# Altium schematic symbol library AliPadash.SchLib: 1186 symbols (part 4 of 6) (continued)
## MYC2_CON80 (continued)
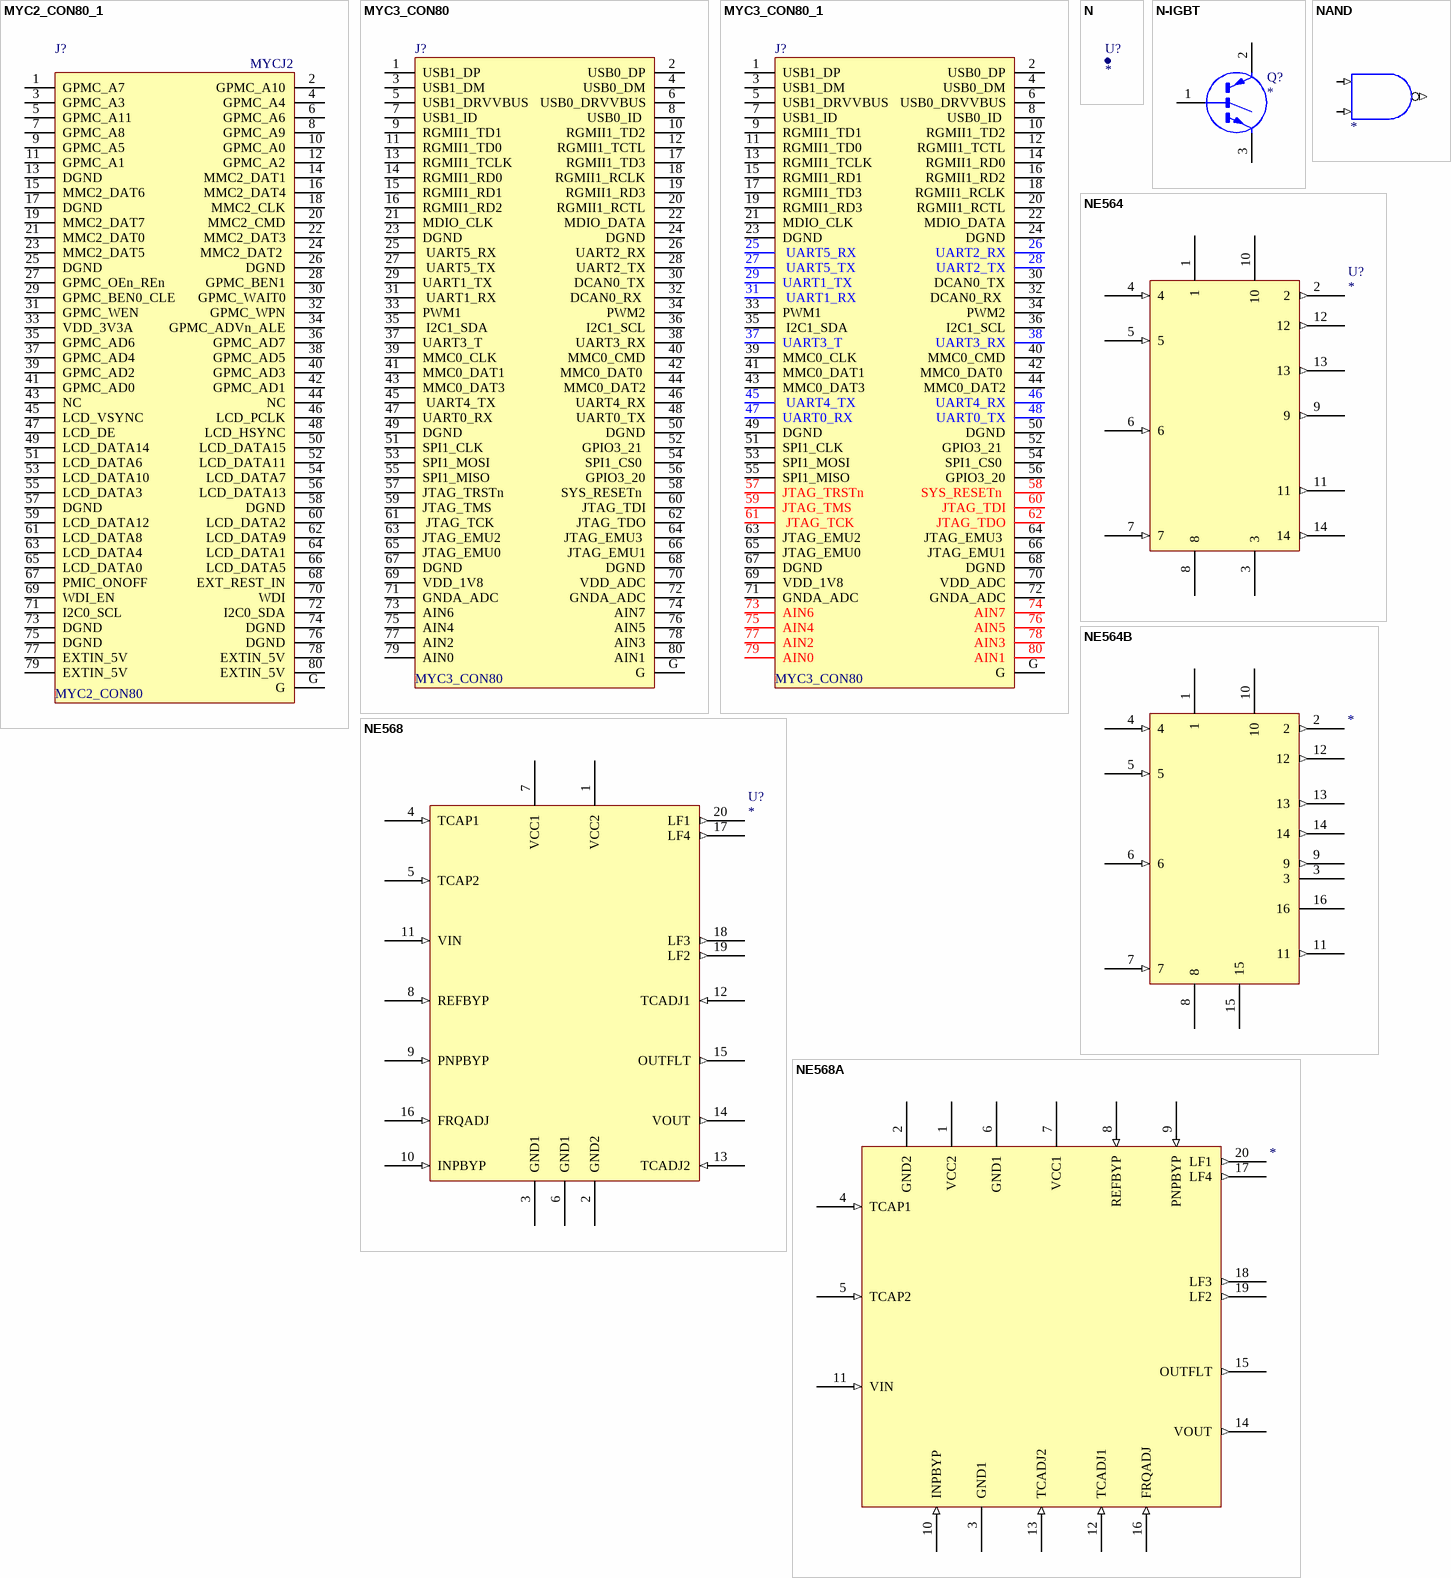
[diagram p45: symbols MYC2_CON80_1 to NE568A]
text: MYCJ2

## MYC2_CON80_1
designator J?, comment MYC2_CON80
footprint BTB2X40F (SON, 80-Leads, Body 36/20x6/00mm, Pitch 0/80mm, IPC Medium Density)
pins: 1 GPMC_A7, 2 GPMC_A10, 3 GPMC_A3, 4 GPMC_A4, 5 GPMC_A11, 6 GPMC_A6, 7 GPMC_A8, 8 GPMC_A9, 9 GPMC_A5, 10 GPMC_A0, 11 GPMC_A1, 12 GPMC_A2, 13 DGND, 14 MMC2_DAT1, 15 MMC2_DAT6, 16 MMC2_DAT4, 17 DGND, 18 MMC2_CLK, 19 MMC2_DAT7, 20 MMC2_CMD, 21 MMC2_DAT0, 22 MMC2_DAT3, 23 MMC2_DAT5 , 24 MMC2_DAT2 , 25 DGND, 26 DGND, 27 GPMC_OEn_REn, 28 GPMC_BEN1, 29 GPMC_BEN0_CLE, 30 GPMC_WAIT0, 31 GPMC_WEN, 32 GPMC_WPN, 33 VDD_3V3A, 34 GPMC_ADVn_ALE, 35 GPMC_AD6, 36 GPMC_AD7, 37 GPMC_AD4, 38 GPMC_AD5, 39 GPMC_AD2, 40 GPMC_AD3, 41 GPMC_AD0, 42 GPMC_AD1, 43 NC, 44 NC, 45 LCD_VSYNC, 46 LCD_PCLK, 47 LCD_DE, 48 LCD_HSYNC, 49 LCD_DATA14, 50 LCD_DATA15, 51 LCD_DATA6, 52 LCD_DATA11, 53 LCD_DATA10, 54 LCD_DATA7, 55 LCD_DATA3, 56 LCD_DATA13, 57 DGND, 58 DGND, 59 LCD_DATA12, 60 LCD_DATA2, 61 LCD_DATA8, 62 LCD_DATA9, 63 LCD_DATA4, 64 LCD_DATA1, 65 LCD_DATA0, 66 LCD_DATA5, 67 PMIC_ONOFF, 68 EXT_REST_IN, 69 WDI_EN, 70 WDI, 71 I2C0_SCL, 72 I2C0_SDA, 73 DGND, 74 DGND, 75 DGND, 76  DGND, 77 EXTIN_5V, 78 EXTIN_5V, 79 EXTIN_5V, 80 EXTIN_5V, G
text: MYCJ2

## MYC3_CON80
designator J?
footprint BTB2X40 (SON, 80-Leads, Body 36/20x6/00mm, Pitch 0/80mm, IPC Medium Density)
footprint BTB2X40F (SON, 80-Leads, Body 36/20x6/00mm, Pitch 0/80mm, IPC Medium Density)
pins: 1 USB1_DP, 2 USB0_DP, 3 USB1_DM, 4 USB0_DM, 5 USB1_DRVVBUS, 6 USB0_DRVVBUS, 7 USB1_ID, 8 USB0_ID , 9 RGMII1_TD1, 10 RGMII1_TD2, 11 RGMII1_TD0, 12 RGMII1_TCTL, 13 RGMII1_TCLK, 14 RGMII1_RD0, 15 RGMII1_RD1, 16 RGMII1_RD2, 17 RGMII1_TD3, 18 RGMII1_RCLK, 19 RGMII1_RD3, 20 RGMII1_RCTL, 21 MDIO_CLK, 22 MDIO_DATA, 23 DGND, 24 DGND, 25  UART5_RX, 26 UART2_RX, 27  UART5_TX, 28 UART2_TX, 29 UART1_TX, 30 DCAN0_TX, 31  UART1_RX, 32 DCAN0_RX , 33 PWM1, 34 PWM2, 35  I2C1_SDA, 36 I2C1_SCL, 37 UART3_T, 38 UART3_RX, 39 MMC0_CLK, 40 MMC0_CMD, 41 MMC0_DAT1, 42 MMC0_DAT0 , 43 MMC0_DAT3, 44 MMC0_DAT2, 45  UART4_TX, 46 UART4_RX, 47 UART0_RX, 48 UART0_TX, 49 DGND, 50 DGND, 51 SPI1_CLK, 52 GPIO3_21 , 53 SPI1_MOSI, 54 SPI1_CS0 , 55 SPI1_MISO, 56 GPIO3_20, 57 JTAG_TRSTn, 58 SYS_RESETn , 59 JTAG_TMS, 60 JTAG_TDI, 61  JTAG_TCK, 62 JTAG_TDO, 63 JTAG_EMU2, 64 JTAG_EMU3 , 65 JTAG_EMU0, 66 JTAG_EMU1, 67 DGND, 68 DGND, 69 VDD_1V8, 70 VDD_ADC, 71 GNDA_ADC, 72 GNDA_ADC, 73 AIN6, 74 AIN7, 75 AIN4, 76 AIN5, 77 AIN2, 78 AIN3, 79 AIN0, 80 AIN1, G

## MYC3_CON80_1
designator J?, comment MYC3_CON80
footprint BTB2X40 (SON, 80-Leads, Body 36/20x6/00mm, Pitch 0/80mm, IPC Medium Density)
footprint BTB2X40F_1 (SON, 80-Leads, Body 36/20x6/00mm, Pitch 0/80mm, IPC Medium Density)
pins: 1 USB1_DP, 2 USB0_DP, 3 USB1_DM, 4 USB0_DM, 5 USB1_DRVVBUS, 6 USB0_DRVVBUS, 7 USB1_ID, 8 USB0_ID , 9 RGMII1_TD1, 10 RGMII1_TD2, 11 RGMII1_TD0, 12 RGMII1_TCTL, 13 RGMII1_TCLK, 14 RGMII1_RD0, 15 RGMII1_RD1, 16 RGMII1_RD2, 17 RGMII1_TD3, 18 RGMII1_RCLK, 19 RGMII1_RD3, 20 RGMII1_RCTL, 21 MDIO_CLK, 22 MDIO_DATA, 23 DGND, 24 DGND, 25  UART5_RX, 26 UART2_RX, 27  UART5_TX, 28 UART2_TX, 29 UART1_TX, 30 DCAN0_TX, 31  UART1_RX, 32 DCAN0_RX , 33 PWM1, 34 PWM2, 35  I2C1_SDA, 36 I2C1_SCL, 37 UART3_T, 38 UART3_RX, 39 MMC0_CLK, 40 MMC0_CMD, 41 MMC0_DAT1, 42 MMC0_DAT0 , 43 MMC0_DAT3, 44 MMC0_DAT2, 45  UART4_TX, 46 UART4_RX, 47 UART0_RX, 48 UART0_TX, 49 DGND, 50 DGND, 51 SPI1_CLK, 52 GPIO3_21 , 53 SPI1_MOSI, 54 SPI1_CS0 , 55 SPI1_MISO, 56 GPIO3_20, 57 JTAG_TRSTn, 58 SYS_RESETn , 59 JTAG_TMS, 60 JTAG_TDI, 61  JTAG_TCK, 62 JTAG_TDO, 63 JTAG_EMU2, 64 JTAG_EMU3 , 65 JTAG_EMU0, 66 JTAG_EMU1, 67 DGND, 68 DGND, 69 VDD_1V8, 70 VDD_ADC, 71 GNDA_ADC, 72 GNDA_ADC, 73 AIN6, 74 AIN7, 75 AIN4, 76 AIN5, 77 AIN2, 78 AIN3, 79 AIN0, 80 AIN1, G

## N
designator U?

## N-IGBT
designator Q?
footprint SMD-23
footprint TO-92
footprint TO-18B
footprint SMD-24
pins: 1 B, 2 E, 3 E

## NAND
designator ?
pins: 1 (in), 2 (in), 3 (out)

## NE564
designator U?
pins: 1, 2 (out), 3, 4 (in), 5 (in), 6 (in), 7 (in), 8, 9 (out), 10, 11 (out), 12 (out), 13 (out), 14 (out)

## NE564B
designator ?
pins: 1, 2 (out), 3, 4 (in), 5 (in), 6 (in), 7 (in), 8, 9 (out), 10, 11 (out), 12 (out), 13 (out), 14 (out), 15, 16

## NE568
designator U?
pins: 1 VCC2, 2 GND2, 3 GND1, 4 TCAP1 (in), 5 TCAP2 (in), 6 GND1, 7 VCC1, 8 REFBYP (in), 9 PNPBYP (in), 10 INPBYP (in), 11 VIN (in), 12 TCADJ1 (in), 13 TCADJ2 (in), 14 VOUT (out), 15 OUTFLT (out), 16 FRQADJ (in), 17 LF4 (out), 18 LF3 (out), 19 LF2 (out), 20 LF1 (out)

## NE568A
designator ?
pins: 1 VCC2, 2 GND2, 3 GND1, 4 TCAP1 (in), 5 TCAP2 (in), 6 GND1, 7 VCC1, 8 REFBYP (in), 9 PNPBYP (in), 10 INPBYP (in), 11 VIN (in), 12 TCADJ1 (in), 13 TCADJ2 (in), 14 VOUT (out), 15 OUTFLT (out), 16 FRQADJ (in), 17 LF4 (out), 18 LF3 (out), 19 LF2 (out), 20 LF1 (out)

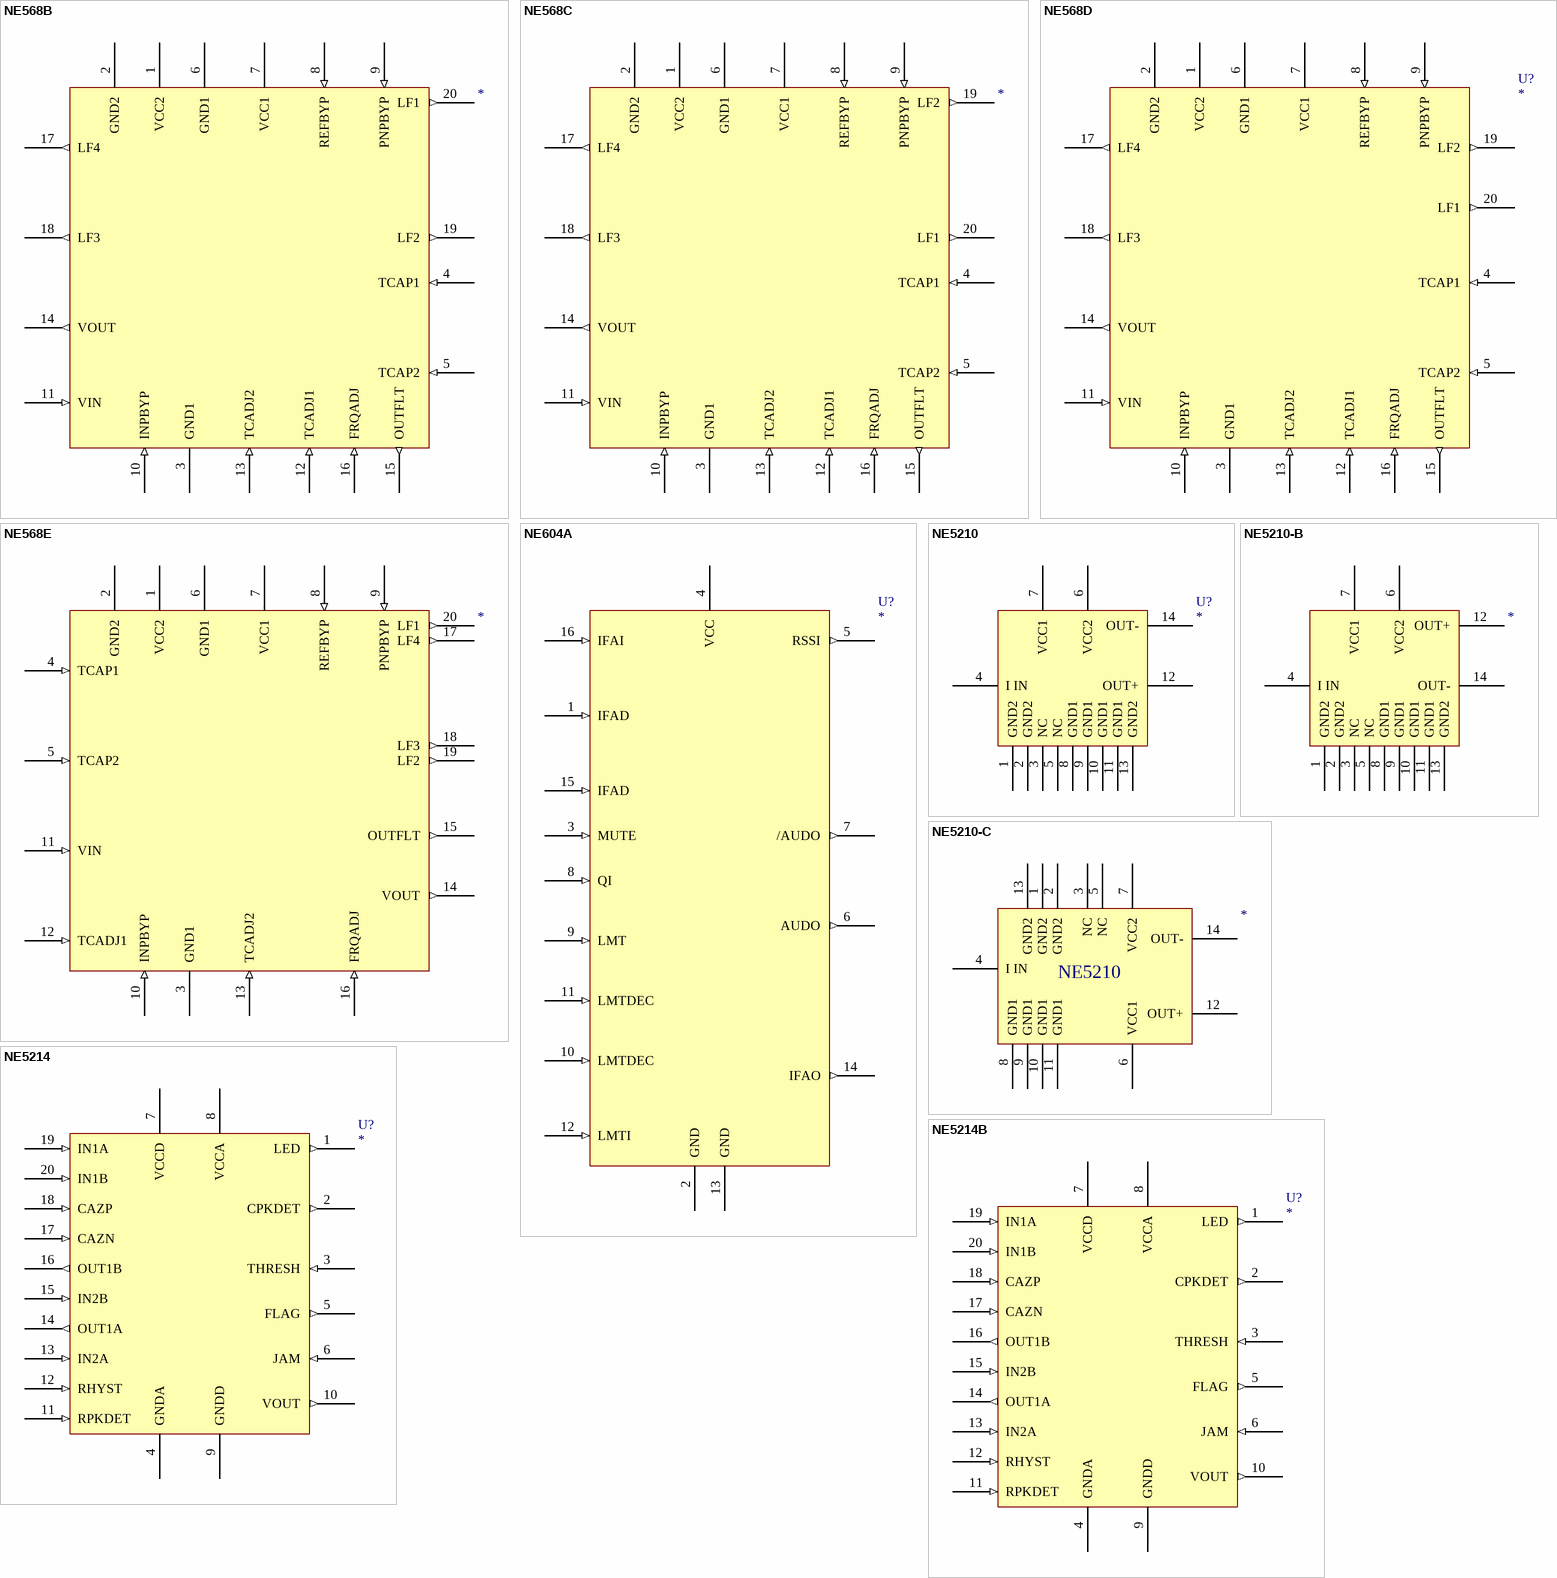
[diagram p46: symbols NE568B to NE5214B]

## NE568B
designator ?
pins: 1 VCC2, 2 GND2, 3 GND1, 4 TCAP1 (in), 5 TCAP2 (in), 6 GND1, 7 VCC1, 8 REFBYP (in), 9 PNPBYP (in), 10 INPBYP (in), 11 VIN (in), 12 TCADJ1 (in), 13 TCADJ2 (in), 14 VOUT (out), 15 OUTFLT (out), 16 FRQADJ (in), 17 LF4 (out), 18 LF3 (out), 19 LF2 (out), 20 LF1 (out)

## NE568C
designator ?
pins: 1 VCC2, 2 GND2, 3 GND1, 4 TCAP1 (in), 5 TCAP2 (in), 6 GND1, 7 VCC1, 8 REFBYP (in), 9 PNPBYP (in), 10 INPBYP (in), 11 VIN (in), 12 TCADJ1 (in), 13 TCADJ2 (in), 14 VOUT (out), 15 OUTFLT (out), 16 FRQADJ (in), 17 LF4 (out), 18 LF3 (out), 19 LF2 (out), 20 LF1 (out)

## NE568D
designator U?
footprint DIP20
pins: 1 VCC2, 2 GND2, 3 GND1, 4 TCAP1 (in), 5 TCAP2 (in), 6 GND1, 7 VCC1, 8 REFBYP (in), 9 PNPBYP (in), 10 INPBYP (in), 11 VIN (in), 12 TCADJ1 (in), 13 TCADJ2 (in), 14 VOUT (out), 15 OUTFLT (out), 16 FRQADJ (in), 17 LF4 (out), 18 LF3 (out), 19 LF2 (out), 20 LF1 (out)

## NE568E
designator ?
pins: 1 VCC2, 2 GND2, 3 GND1, 4 TCAP1 (in), 5 TCAP2 (in), 6 GND1, 7 VCC1, 8 REFBYP (in), 9 PNPBYP (in), 10 INPBYP (in), 11 VIN (in), 12 TCADJ1 (in), 13 TCADJ2 (in), 14 VOUT (out), 15 OUTFLT (out), 16 FRQADJ (in), 17 LF4 (out), 18 LF3 (out), 19 LF2 (out), 20 LF1 (out)

## NE604A
designator U?
pins: 1 IFAD (in), 2 GND, 3 MUTE (in), 4 VCC, 5 RSSI (out), 6 AUDO (out), 7 /AUDO (out), 8 QI (in), 9 LMT (in), 10 LMTDEC (in), 11 LMTDEC (in), 12 LMTI (in), 13 GND, 14 IFAO (out), 15 IFAD (in), 16 IFAI (in)

## NE5210
designator U?
pins: 1 GND2, 2 GND2, 3 NC, 4 I IN, 5 NC, 6 VCC2, 7 VCC1, 8 GND1, 9 GND1, 10 GND1, 11 GND1, 12 OUT+, 13 GND2, 14 OUT-

## NE5210-B
designator ?
pins: 1 GND2, 2 GND2, 3 NC, 4 I IN, 5 NC, 6 VCC2, 7 VCC1, 8 GND1, 9 GND1, 10 GND1, 11 GND1, 12 OUT+, 13 GND2, 14 OUT-

## NE5210-C
designator ?
pins: 1 GND2, 2 GND2, 3 NC, 4 I IN, 5 NC, 6 VCC1, 7 VCC2, 8 GND1, 9 GND1, 10 GND1, 11 GND1, 12 OUT+, 13 GND2, 14 OUT-
text: NE5210

## NE5214
designator U?
pins: 1 LED (out), 2 CPKDET (out), 3 THRESH (in), 4 GNDA, 5 FLAG (out), 6 JAM (in), 7 VCCD, 8 VCCA, 9 GNDD, 10 VOUT (out), 11 RPKDET (in), 12 RHYST (in), 13 IN2A (in), 14 OUT1A (out), 15 IN2B (in), 16 OUT1B (out), 17 CAZN (in), 18 CAZP (in), 19 IN1A (in), 20 IN1B (in)

## NE5214B
designator U?
pins: 1 LED (out), 2 CPKDET (out), 3 THRESH (in), 4 GNDA, 5 FLAG (out), 6 JAM (in), 7 VCCD, 8 VCCA, 9 GNDD, 10 VOUT (out), 11 RPKDET (in), 12 RHYST (in), 13 IN2A (in), 14 OUT1A (out), 15 IN2B (in), 16 OUT1B (out), 17 CAZN (in), 18 CAZP (in), 19 IN1A (in), 20 IN1B (in)

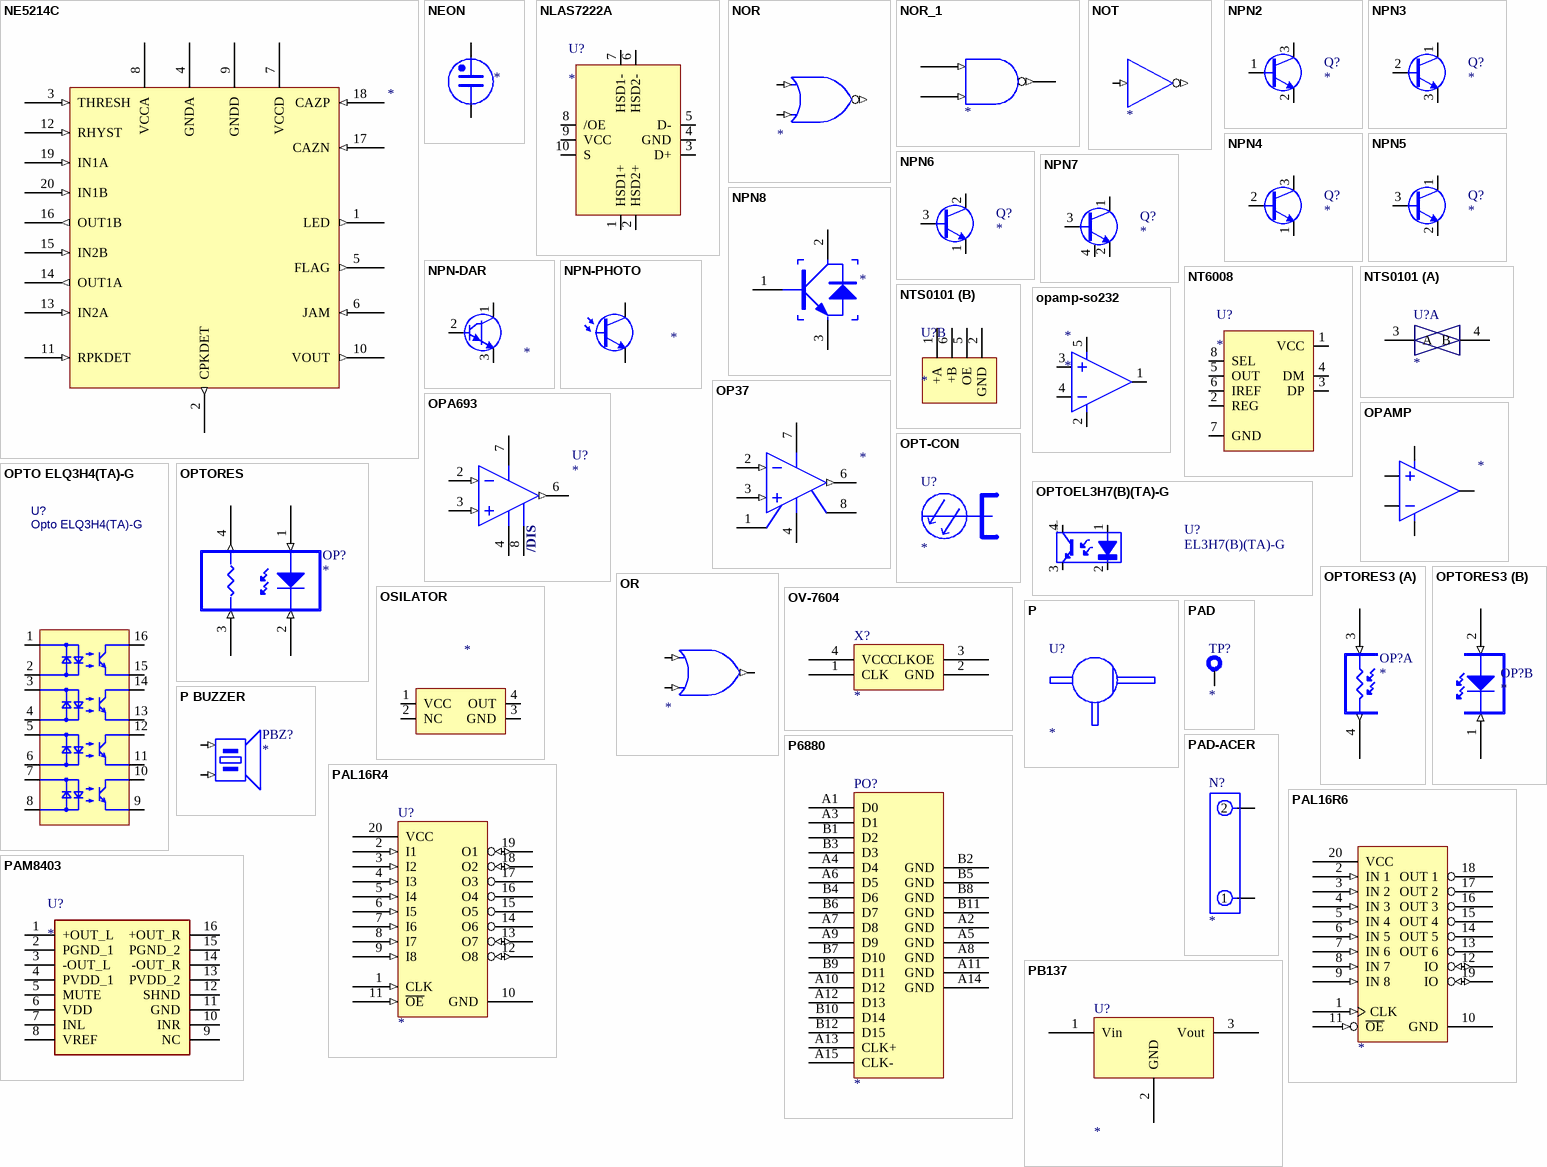
[diagram p47: symbols NE5214C to PB137]

## NE5214C
designator ?
pins: 1 LED (out), 2 CPKDET (out), 3 THRESH (in), 4 GNDA, 5 FLAG (out), 6 JAM (in), 7 VCCD, 8 VCCA, 9 GNDD, 10 VOUT (out), 11 RPKDET (in), 12 RHYST (in), 13 IN2A (in), 14 OUT1A (out), 15 IN2B (in), 16 OUT1B (out), 17 CAZN (in), 18 CAZP (in), 19 IN1A (in), 20 IN1B (in)

## NEON
designator ?
pins: 1, 2

## NLAS7222A
designator U?
footprint WQFN10
pins: 1 HSD1+, 2 HSD2+, 3 D+, 4 GND, 5 D-, 6 HSD2-, 7 HSD1-, 8 /OE, 9 VCC, 10 S

## NOR
designator ?
pins: 1 (in), 2 (in), 3 (out)

## NOR_1
designator ?
pins: ?1 I0 (in), ?2 I1 (in), ?3 O (out)

## NOT
designator ?
pins: 1 (in), 2 (out)

## NPN2
designator Q?
footprint SMD-23
footprint TO-92
footprint TO-220
pins: 1 B, 2 E, 3 C

## NPN3
designator Q?
footprint SMD-23
footprint TO-92
footprint TO-220
pins: 1 C, 2 B, 3 E

## NPN4
designator Q?
footprint SMD-23
pins: 1 E, 2 B, 3 C

## NPN5
designator Q?
pins: 1 C, 2 E, 3 B

## NPN6
designator Q?
pins: 1 E, 2 C, 3 B

## NPN7
designator Q?
pins: 1 C, 2 E, 3 B, 4 E

## NPN8
designator ?
pins: 1 B, 2 C, 3 E

## NPN-DAR
designator ?
pins: 1 C, 2 B, 3 E

## NPN-PHOTO
designator ?
pins: C, E

## NT6008
designator U?
pins: 1 VCC, 2 REG, 3 DP, 4 DM, 5 OUT, 6 IREF, 7 GND, 8 SEL

## NTS0101
designator U?
footprint SOT363
part A pins: 3 A, 4 B
part B pins: 1 +A, 2 GND, 5 OE, 6 +B

## OP37
designator ?
pins: 1 TRIM, 2 -IN (in), 3 +IN (in), 4 V- (power), 6 OUT (out), 7 V+ (power), 8 TRIM

## OPA693
designator U?
pins: 2 -IN (in), 3 +IN (in), 4 V- (power), 6 OUT (out), 7 V+ (power), 8 /DIS

## OPAMP
designator ?
pins: 1, 2, 3, 4, 5

## opamp-so232
designator *
pins: 1, 2, 3 2, 4, 5

## OPT-CON
designator U?

## OPTO ELQ3H4(TA)-G
designator U?, comment Opto ELQ3H4(TA)-G
JLC: C150957; MFAC: ELQ3H4(TA)-G
footprint SOP-16_L10.3-W4.4-P1.27-LS7.0-BL
pins: 1 A-C1, 2 C-A1, 3 A-C2, 4 C-A2, 5 A-C3, 6 C-A3, 7 A-C4, 8 C-A4, 9 EMI1, 10 COL1, 11 EMI2, 12 CO2, 13 EMI3, 14 COL3, 15 EMI4, 16 COL4

## OPTOEL3H7(B)(TA)-G
designator U?, comment EL3H7(B)(TA)-G
MFAC: C32565; JLC: C32565
footprint SOP-4-1.27mm
pins: 1 A, 2 C, 3 E, 4 CL
text: @DesignPCB

## OPTORES
designator OP?
footprint OPR
pins: 1 A (in), 2 C (in), 3 E (in), 4 CL (out)

## OPTORES3
designator OP?
footprint OPR
part A pins: 3 E (in), 4 CL (out)
part B pins: 1 A (in), 2 C (in)

## OR
designator ?
pins: 1 (in), 2 (in), 3 (out)

## OSILATOR
designator ?
footprint OSILATOR
pins: 1 VCC, 2 NC, 3 GND, 4 OUT

## OV-7604
designator X?
footprint OV7604
pins: 1 CLK, 2 GND, 3 CLKOE, 4 VCC

## P
designator U?

## P6880
designator PO?
PROB FOR P6860 AND P6880 LOGIC ANALYZER
footprint P6860
pins: A1 D0, A2 GND, A3 D1, A4 D4, A5 GND, A6 D5, A7 D8, A8 GND, A9 D9, A10 D12, A11 GND, A12 D13, A13 CLK+, A14 GND, A15 CLK-, B1 D2, B2 GND, B3 D3, B4 D6, B5 GND, B6 D7, B7 D10, B8 GND, B9 D11, B10 D14, B11 GND, B12 D15

## P BUZZER
designator PBZ?
footprint BUZER2
pins: 1 (in), 2 (in)

## PAD
designator TP?
footprint TP1
pins: 1

## PAD-ACER
designator N?
pins: 1, 2

## PAL16R4
designator U?
footprint DIP20
pins: 1 CLK (in), 2 I1 (in), 3 I2 (in), 4 I3 (in), 5 I4 (in), 6 I5 (in), 7 I6 (in), 8 I7 (in), 9 I8 (in), 10 GND (power), 11 ~{OE} (in), 12 O8 (io), 13 O7 (io), 14 O6 (hiz), 15 O5 (hiz), 16 O4 (hiz), 17 O3 (hiz), 18 O2 (io), 19 O1 (io), 20 VCC (power)

## PAL16R6
designator ?
pins: 1 CLK (in), 2 IN 1 (in), 3 IN 2 (in), 4 IN 3 (in), 5 IN 4 (in), 6 IN 5 (in), 7 IN 6 (in), 8 IN 7 (in), 9 IN 8 (in), 10 GND (power), 11 ~{OE} (in), 12 IO (io), 13 OUT 6 (hiz), 14 OUT 5 (hiz), 15 OUT 4 (hiz), 16 OUT 3 (hiz), 17 OUT 2 (hiz), 18 OUT 1 (hiz), 19 IO (io), 20 VCC (power)

## PAM8403
designator U?
footprint SO-16
pins: 1 +OUT_L, 2 PGND_1, 3 -OUT_L, 4 PVDD_1, 5 MUTE, 6 VDD, 7 INL, 8 VREF, 9 NC, 10 INR, 11 GND, 12 SHND, 13 PVDD_2, 14 -OUT_R, 15 PGND_2, 16 +OUT_R

## PB137
designator U?
footprint TO-220
pins: 1 Vin, 2 GND, 3 Vout

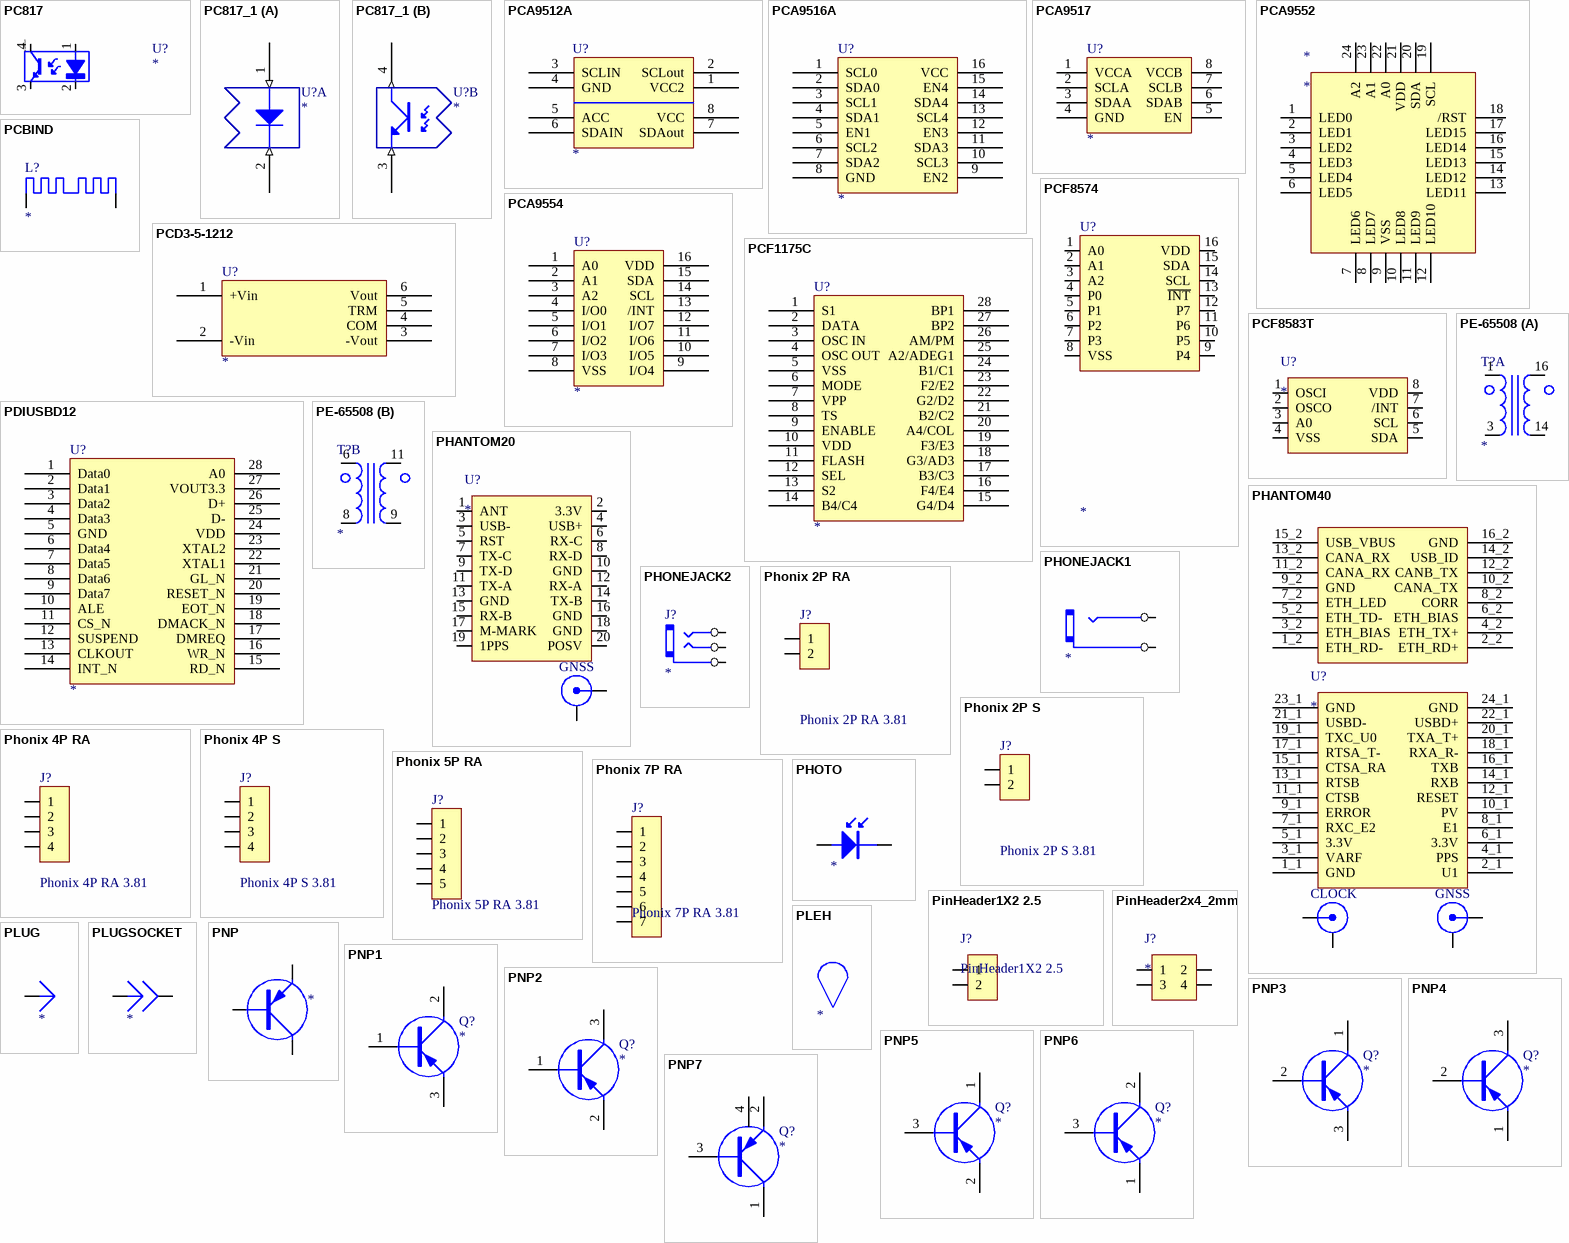
[diagram p48: symbols PC817 to PNP7]

## PC817
designator U?
footprint DIP4
pins: 1 A, 2 C, 3 E, 4 CL
text: @DesignPCB

## PC817_1
designator U?
footprint DIP4
part A pins: 1 A (in), 2 C (in)
part B pins: 3 E (in), 4 CL (out)

## PCA9512A
designator U?
footprint SO-8
pins: 1 VCC2, 2 SCLout, 3 SCLIN, 4 GND, 5 ACC, 6 SDAIN, 7 SDAout, 8 VCC

## PCA9516A
designator U?
footprint SO-16
pins: 1 SCL0, 2 SDA0, 3 SCL1, 4 SDA1, 5 EN1, 6 SCL2, 7 SDA2, 8 GND, 9 EN2, 10 SCL3, 11 SDA3, 12 EN3, 13 SCL4, 14 SDA4, 15 EN4, 16 VCC

## PCA9517
designator U?
footprint SO-8
pins: 1 VCCA, 2 SCLA, 3 SDAA, 4 GND, 5 EN, 6 SDAB, 7 SCLB, 8 VCCB

## PCA9552
designator *
footprint HVQFN24 (PQFN, 24-Leads, Body 4.00x4.00mm, Pitch 0.50mm, Thermal Pad 2.10x2.10mm, IPC Medium Density)
pins: 1 LED0, 2 LED1, 3 LED2, 4 LED3, 5 LED4, 6 LED5, 7 LED6, 8 LED7, 9 VSS, 10 LED8, 11 LED9, 12 LED10, 13 LED11, 14 LED12, 15 LED13, 16 LED14, 17 LED15, 18 /RST, 19 SCL, 20 SDA, 21 VDD, 22 A0, 23 A1, 24 A2

## PCA9554
designator U?
footprint TSSOP16
pins: 1 A0, 2 A1, 3 A2, 4 I/O0, 5 I/O1, 6 I/O2, 7 I/O3, 8 VSS, 9 I/O4, 10 I/O5, 11 I/O6, 12 I/O7, 13 /INT, 14 SCL, 15 SDA, 16 VDD

## PCBIND
designator L?
footprint PCBIND1
footprint PCBIND2
footprint PCBIND3
footprint PCBIND3
pins: 1 SDO, 2 SDO

## PCD3-5-1212
designator U?
footprint PCD3
pins: 1 +Vin, 2 -Vin, 3 -Vout, 4 COM, 5 TRM, 6 Vout

## PCF1175C
designator U?
footprint SOI-28
pins: 1 S1, 2 DATA, 3 OSC IN, 4 OSC OUT, 5 VSS, 6 MODE, 7 VPP, 8 TS, 9 ENABLE, 10 VDD, 11 FLASH, 12 SEL, 13 S2, 14 B4/C4, 15 G4/D4, 16 F4/E4, 17 B3/C3, 18 G3/AD3, 19 F3/E3, 20 A4/COL, 21 B2/C2, 22 G2/D2, 23 F2/E2, 24 B1/C1, 25 A2/ADEG1, 26 AM/PM, 27 BP2, 28 BP1

## PCF8574
designator U?
footprint SOT162
pins: 1 A0, 2 A1, 3 A2, 4 P0, 5 P1, 6 P2, 7 P3, 8 VSS, 9 P4, 10 P5, 11 P6, 12 P7, 13 ~{INT}, 14 SCL, 15 SDA, 16 VDD

## PCF8583T
designator U?
footprint SO-8-B2
pins: 1 OSCI, 2 OSCO, 3 A0, 4 VSS, 5 SDA, 6 SCL, 7 /INT, 8 VDD

## PDIUSBD12
designator U?
footprint TSSOP28
pins: 1 Data0, 2 Data1, 3 Data2, 4 Data3, 5 GND, 6 Data4, 7 Data5, 8 Data6, 9 Data7, 10 ALE, 11 CS_N, 12 SUSPEND, 13 CLKOUT, 14 INT_N, 15 RD_N, 16 WR_N, 17 DMREQ, 18 DMACK_N, 19 EOT_N, 20 RESET_N, 21 GL_N, 22 XTAL1, 23 XTAL2, 24 VDD, 25 D-, 26 D+, 27 VOUT3.3, 28 A0

## PE-65508
designator T?
footprint 16-PE-655XX
part A pins: 1, 3, 14, 16
part B pins: 6, 8, 9, 11

## PHANTOM20
designator U?
footprint PHANTOM20
pins: 1 ANT, 2 3.3V, 3 USB-, 4 USB+, 5 RST, 6 RX-C, 7 TX-C, 8 RX-D, 9 TX-D, 10 GND, 11 TX-A, 12 RX-A, 13 GND, 14 TX-B, 15 RX-B, 16 GND, 17 M-MARK, 18 GND, 19 1PPS, 20 POSV, ANT, G3
text: GNSS

## PHANTOM40
designator U?
footprint PHANTOM40C
pins: 1_1 GND, 1_2 ETH_RD-, 2_1 U1, 2_2 ETH_RD+, 3_1 VARF, 3_2 ETH_BIAS, 4_1 PPS, 4_2 ETH_TX+, 5_1 3.3V, 5_2 ETH_TD-, 6_1 3.3V, 6_2 ETH_BIAS, 7_1 RXC_E2, 7_2 ETH_LED, 8_1 E1, 8_2 CORR, 9_1 ERROR, 9_2 GND, 10_1 PV, 10_2 CANA_TX, 11_1 CTSB, 11_2 CANA_RX, 12_1 RESET, 12_2 CANB_TX, 13_1 RTSB, 13_2 CANA_RX, 14_1 RXB, 14_2 USB_ID, 15_1 CTSA_RA, 15_2 USB_VBUS, 16_1 TXB, 16_2 GND, 17_1 RTSA_T-, 18_1 RXA_R-, 19_1 TXC_U0, 20_1 TXA_T+, 21_1 USBD-, 22_1 USBD+, 23_1 GND, 24_1 GND, C1, C2, G1, G2
text: CLOCK; GNSS

## PHONEJACK1
designator ?
pins: 1, 2

## PHONEJACK2
designator J?
footprint JAK-PHONE2
pins: 1, 2, 3

## Phonix 2P RA
designator J?, comment Phonix 2P RA 3.81
MFAC: WJ15EDGRC-3.81-2P; JLC: C8387; Parameter 1: *
footprint TER2-R-3.81
pins: 1, 2

## Phonix 2P S
designator J?, comment Phonix 2P S 3.81
ManufacturerName: WJ15EDGVC-3.81-2P; JLCPCB: C8396
footprint TER2-3.81
pins: 1, 2

## Phonix 4P RA
designator J?, comment Phonix 4P RA 3.81
MFAC: DB2ERC-3.81-4P-GN; JLC: C395698
footprint TER4-R-3.81
pins: 1, 2, 3, 4

## Phonix 4P S
designator J?, comment Phonix 4P S 3.81
ManufacturerName: WJ15EDGVC-3.81-4P; JLCPCB: C8410
footprint TER4-3.81
pins: 1, 2, 3, 4

## Phonix 5P RA
designator J?, comment Phonix 5P RA 3.81
MFAC: WJ15EDGRC-3.81-5P; JLC: C8395
footprint TER5-R-3.81
pins: 1, 2, 3, 4, 5

## Phonix 7P RA
designator J?, comment Phonix 7P RA 3.81
ManufacturerName: XY2500R-F-3.81-7P; JLCPCB: C880586
footprint TER7-R-3.81 (Footprint not found)
pins: 1, 2, 3, 4, 5, 6, 7

## PHOTO
designator ?
pins: A, K

## PinHeader1X2 2.5
designator J?
MFAC: MTP125-1102S1; JLC: C358684
footprint SIP2
pins: 1, 2

## PinHeader2x4_2mm
designator J?
MFAC: A2005WV-2x2P; JLC: C225287
footprint PinHeader2x2_2mm
pins: 1, 2, 3, 4

## PLEH
designator ?

## PLUG
designator ?
pins: 1

## PLUGSOCKET
designator ?
pins: 1, 2

## PNP
designator ?
pins: B, C, E

## PNP1
designator Q?
footprint SMD-23
footprint TO-92
footprint TO-18B
footprint SMD-24
pins: 1 B, 2 C, 3 E

## PNP2
designator Q?
footprint SMD-23
footprint TO-92
footprint TO-18B
footprint SMD-24
pins: 1 B, 2 E, 3 C

## PNP3
designator Q?
footprint SMD-23
footprint TO-92
footprint TO-18B
footprint SMD-24
pins: 1 C, 2 B, 3 E

## PNP4
designator Q?
footprint SMD-23
footprint TO-92
footprint TO-18B
footprint SMD-24
pins: 1 E, 2 B, 3 C

## PNP5
designator Q?
footprint SMD-23
footprint TO-92
footprint TO-18B
footprint SMD-24
pins: 1 C, 2 E, 3 B

## PNP6
designator Q?
footprint SMD-23
footprint TO-92
footprint TO-18B
footprint SMD-24
pins: 1 E, 2 E, 3 B

## PNP7
designator Q?
pins: 1 C, 2 E, 3 B, 4 E

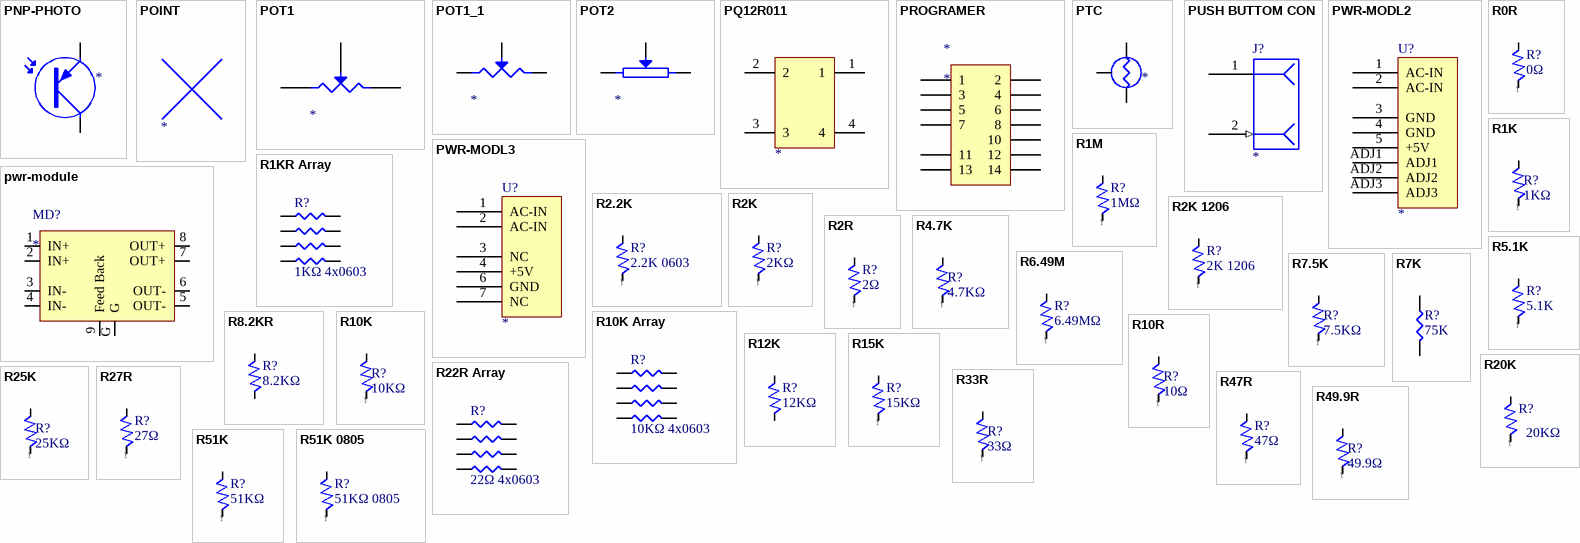
[diagram p49: symbols PNP-PHOTO to R51K 0805]

## PNP-PHOTO
designator ?
pins: C, E

## POINT
designator ?

## POT1
designator ?
pins: 1, 2, 3

## POT1_1
designator ?
pins: 1, 2, 3

## POT2
designator ?
pins: 1, 2, W

## PQ12R011
designator ?
pins: 1, 2, 3, 4

## PROGRAMER
designator *
footprint HDR2X7B
pins: 1, 2, 3, 4, 5, 6, 7, 8, 10, 11, 12, 13, 14

## PTC
designator ?
pins: 1, 2, 3

## PUSH BUTTOM CON
designator J?
pins: 1, 2 (in)

## PWR-MODL2
designator U?
footprint PWR-MODL2
pins: 1 AC-IN, 2 AC-IN, 3 GND, 4 GND, 5 +5V, ADJ1, ADJ2, ADJ3

## PWR-MODL3
designator U?
footprint PWR-MODL2
pins: 1 AC-IN, 2 AC-IN, 3 NC, 4 +5V, 6 GND, 7 NC

## pwr-module
designator MD?
footprint PWR-MDL5
pins: 1 IN+, 2 IN+, 3 IN-, 4 IN-, 5 OUT-, 6 OUT-, 7 OUT+, 8 OUT+, 9 Feed Back, G

## R0R
designator R?, comment 0Ω
MFAC: 0603WAF0000T5E; JLC: C21189
footprint 0805
footprint AXIAL0.4
footprint 0402
footprint 0704
footprint 0603
pins: 1, 2
text: @DesignPCB

## R1K
designator R?, comment 1KΩ
MFAC: 0603WAF1001T5E; JLC: C21190
footprint 0805
footprint AXIAL0.4
footprint 0402
footprint 0704
footprint 0603
pins: 1, 2
text: @DesignPCB

## R1KR Array
designator R?, comment 1KΩ 4x0603
MFAC: 4D03WGJ0102T5E; JLC: C20197
footprint 0603ARRAY
pins: 1 R1, 2 R2, 3 R3, 4 R4, 5 R5, 6 R6, 7 R7, 8 R8

## R1M
designator R?, comment 1MΩ
MFAC: 0603WAF1004T5E; JLC: C22935
footprint 0603
footprint AXIAL0.4
footprint 0402
footprint 0704
footprint 0603
pins: 1, 2
text: @DesignPCB

## R2.2K
designator R?, comment 2.2K 0603
MFAC: 0603WAF2201T5E; JLC: C4190
footprint 0805
footprint AXIAL0.4
footprint 0402
footprint 0704
footprint 0603
footprint 0603
pins: 1, 2
text: @DesignPCB

## R2K
designator R?, comment 2KΩ
MFAC: 0603WAF2001T5E; JLC: C22975
footprint 0805
footprint AXIAL0.4
footprint 0402
footprint 0704
footprint 0603
footprint 0603
footprint 0603
pins: 1, 2
text: @DesignPCB

## R2K 1206
designator R?, comment 2K 1206
MFAC: 1206W4F2001T5E; JLC: C17944
footprint 0805
footprint AXIAL0.4
footprint 0402
footprint 0704
footprint 1005
pins: 1, 2
text: @DesignPCB

## R2R
designator R?, comment 2Ω
MFAC: 0603WAF200KT5E; JLC: C22977
footprint 0805
footprint AXIAL0.4
footprint 0402
footprint 0704
footprint 0603
footprint 0603
pins: 1, 2
text: @DesignPCB

## R4.7K
designator R?, comment 4.7KΩ
MFAC: 0603WAF4701T5E; JLC: C23162
footprint 0805
footprint AXIAL0.4
footprint 0402
footprint 0704
footprint 0603
pins: 1, 2
text: @DesignPCB
